# Altium footprint library USB-V11.PcbLib: 36 footprints (part 3 of 3)
Each footprint in its own frame and in the unit in brackets; x right, y up, seen from the top. Pads: shape width x height; smd on the part's side, far side on the other; paste and mask are expansions set on the pad; w line width, h text height; cw(c..) or ccw(c..) is an arc to the next point about the centre after c.
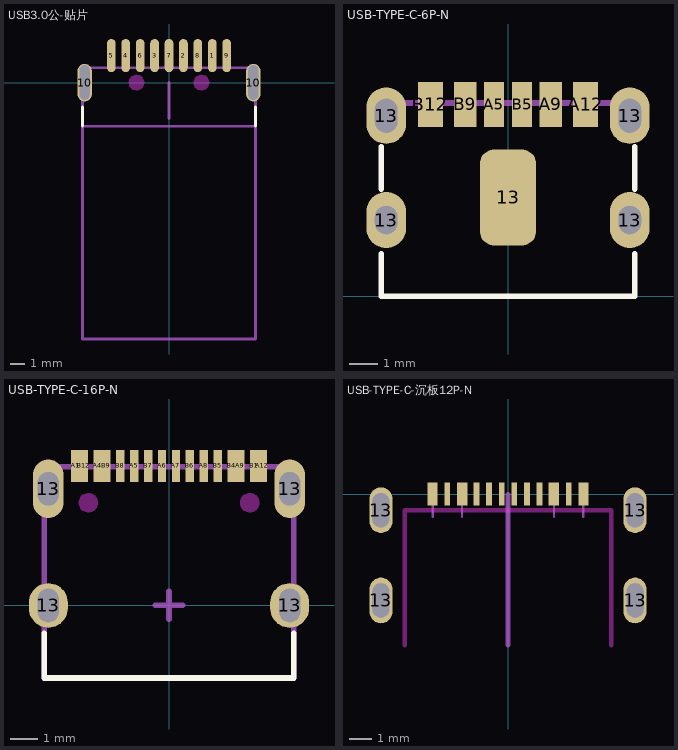
[diagram p2: the footprints below, top view; thin cyan lines are the x and y axes]

## USB3.0公-贴片 [mm]
pads (11):
  oval 0.6x2.3 smd: 1(3,1.87) 2(1,1.87) 3(-1,1.87) 4(-3,1.87) 5(-4,1.87) 6(-2,1.87) 7(0,1.87) 8(2,1.87) 9(4,1.87)
  oval 1x2.6 / inner oval 1x2.6 / far side oval 2x3 hole 0.7 slot 2.4 at 90 deg: 10(-5.85,0) 10(5.85,0)
Top Overlay:
  lines w0.2: -6,-3 -6,-1.7 ; 6,-3 6,-1.7
Keep-Out Layer:
  circle w0.1: c2.25,0 r0.5
  circle w0.1: c-2.25,0 r0.5
  board cut-out: 1.75,0 1.75,-0.099 1.826,-0.283 1.967,-0.424 2.151,-0.5 2.25,-0.5 2.349,-0.5 2.533,-0.424 2.674,-0.283 2.75,-0.099 2.75,0 2.75,0.099 2.674,0.283 2.533,0.424 2.349,0.5 2.25,0.5 2.151,0.5 1.967,0.424 1.826,0.283 1.75,0.099
  board cut-out: -1.75,0 -1.75,-0.099 -1.826,-0.283 -1.967,-0.424 -2.151,-0.5 -2.25,-0.5 -2.349,-0.5 -2.533,-0.424 -2.674,-0.283 -2.75,-0.099 -2.75,0 -2.75,0.099 -2.674,0.283 -2.533,0.424 -2.349,0.5 -2.25,0.5 -2.151,0.5 -1.967,0.424 -1.826,0.283 -1.75,0.099
Mechanical 15:
  lines w0.2: -6,-3.025 6,-3.025 ; 0,-2.5 0,0 ; -6,-17.775 -6,1.025 6,1.025 6,-17.775 -6,-17.775
3D body "692112030100.stp": height 1.8, standoff -2.7, extent -6,-17.95 6,2.8

## USB-TYPE-C-6P-N [mm]
pads (11):
  oval 1.4x2 hole 0.8 slot 1 at 90 deg: 13(-4.32,2.7) 13(4.32,2.7)
  oval 1.4x2 hole 0.8 slot 1.2 at 90 deg: 13(-4.32,6.4) 13(4.32,6.4)
  rrect50% 2x3.4 smd: 13(0,3.5)
  rect 0.7x1.6 smd: A5(-0.5,6.8) B5(0.5,6.8)
  rect 0.8x1.6 smd: A9(1.52,6.8) B9(-1.52,6.8)
  rect 0.9x1.6 smd: A12(2.75,6.8) B12(-2.75,6.8)
Top Overlay:
  lines w0.2: -4.5,1.5 -4.5,0 4.5,0 4.5,1.5 ; -4.5,3.8 -4.5,5.3 ; 4.5,3.8 4.5,5.3
Top Paste:
  drawing of 8 lines, arcs and shapes, not listed
Mechanical 15:
  lines w0.2: -4.5,6.85 4.5,6.85
  text "VBUS" at 2.8,7.8 h0.5
  text "GND" at 1.6,7.8 h0.5
  text "GND" at -2.5,7.8 h0.5
  text "VBUS" at -1.3,7.8 h0.5
  text "CC1" at -0.3,7.8 h0.5
  text "CC2" at 0.6,7.8 h0.5
3D body "632723300011.stp": height 2.98, standoff -1.88, extent -4.37,0 4.37,11.794

## USB-TYPE-C-16P-N [mm]
pads (20):
  oval 1.4x1.6 hole 0.75 slot 1.2 at 90 deg: 13(-4.325,0) 13(4.325,0)
  oval 1.1x2.1 / inner oval 1.1x2.1 / far side oval 1.3x2.1 hole 0.75 slot 1.2 at 90 deg: 13(-4.325,4.18) 13(4.325,4.18)
  rect 0.31x1.14 smd: A1(-3.35,5) A4(-2.55,5) A9(2.55,5) A12(3.35,5) B1(3.05,5) B4(2.25,5) B9(-2.25,5) B12(-3.05,5)
  rect 0.3x1.14 smd: A5(-1.25,5) A6(-0.25,5) A7(0.25,5) A8(1.25,5) B5(1.75,5) B6(0.75,5) B7(-0.75,5) B8(-1.75,5)
Top Overlay:
  lines w0.2: -4.475,-1 -4.475,-2.6 4.475,-2.6 4.475,-1
Keep-Out Layer:
  circle w0.05: c-2.89,3.68 r0.325
  circle w0.05: c2.89,3.68 r0.325
  board cut-out: 2.565,3.68 2.565,3.615 2.614,3.496 2.706,3.404 2.825,3.355 2.89,3.355 2.955,3.355 3.074,3.404 3.166,3.496 3.215,3.615 3.215,3.68 3.215,3.745 3.166,3.864 3.074,3.956 2.955,4.005 2.89,4.005 2.825,4.005 2.706,3.956 2.614,3.864 2.565,3.745
  board cut-out: -3.215,3.68 -3.215,3.615 -3.166,3.496 -3.074,3.404 -2.955,3.355 -2.89,3.355 -2.825,3.355 -2.706,3.404 -2.614,3.496 -2.565,3.615 -2.565,3.68 -2.565,3.745 -2.614,3.864 -2.706,3.956 -2.825,4.005 -2.89,4.005 -2.955,4.005 -3.074,3.956 -3.166,3.864 -3.215,3.745
Mechanical 15:
  lines w0.2: -0.5,0 0.5,0 ; 0,-0.5 0,0.5 ; -4.475,-2.6 -4.475,4.975 4.475,4.975 4.475,-2.6 -4.475,-2.6
  text "GND" at -3,5.75 h0.5
  text "VBUS" at -2.2,5.75 h0.5
  text "GND" at 3.3,5.75 h0.5
  text "VBUS" at 2.5,5.75 h0.5
  text "SBU2" at -1.6,5.75 h0.5
  text "CC1" at -1.1,5.75 h0.5
  text "DN2" at -0.6,5.75 h0.5
  text "DP1" at -0.1,5.75 h0.5
  text "DN1" at 0.4,5.75 h0.5
  text "DP2" at 0.9,5.75 h0.5
  text "SBU1" at 1.4,5.75 h0.5
  text "CC2" at 1.9,5.75 h0.5
3D body "632723300011.stp": height 2.98, standoff -1.88, extent -4.37,-4.7 4.37,7.094

## USB-TYPE-C-沉板12P-N [mm]
pads (20):
  oval 1x2 / inner oval 1x2 / far side oval 1.4x2.2 hole 0.75 slot 1.5 at 90 deg: 13(-5.55,-4.64) 13(-5.55,-0.7) 13(5.55,-4.64) 13(5.55,-0.7)
  rect 0.25x1 smd: A1(-3.4,0) A4(-2.1,0) A5(-0.825,0) A6(-0.275,0) A7(0.275,0) A8(0.825,0) A9(2.1,0) A12(3.4,0) B1(3.2,0) B4(1.9,0) B5(2.65,0) B6(1.375,0) B7(-1.375,0) B8(-2.65,0) B9(-1.9,0) B12(-3.2,0)
Keep-Out Layer:
  lines w0.2: -4.5,-6.6 -4.5,-0.7 4.5,-0.7 4.5,-6.6
Mechanical 15:
  lines w0.1: -3.28,-1 -3.28,0 ; -2.01,-1 -2.01,0 ; 2.01,-1 2.01,0 ; 3.28,-1 3.28,0
  lines w0.2: 0,-6.6 0,0
  text "GND" at -3.125,0.7 h0.5
  text "VBUS" at -1.85,0.7 h0.5
  text "GND" at 3.45,0.7 h0.5
  text "VBUS" at 2.15,0.7 h0.5
  text "SBU2" at -2.475,0.7 h0.5
  text "CC1" at -0.65,0.7 h0.5
  text "DN2" at -1.2,0.7 h0.5
  text "DP1" at -0.125,0.7 h0.5
  text "DN1" at 0.425,0.7 h0.5
  text "DP2" at 1.55,0.7 h0.5
  text "SBU1" at 0.975,0.7 h0.5
  text "CC2" at 2.8,0.7 h0.5